# Altium schematic symbol library SCHLIB.SchLib: 2608 symbols (part 8 of 20) (continued)
## IC-STM32H743VIH6
designator U?, comment STM32H743VIH6
HIGH-PERFORMANCE AND DSP WITH DP; Manufacturer: STMicroelectronics; Supplier 1: Digi-Key; Supplier Part Number 1: 497-STM32H743VIH6-ND; Manufacturer Part Number: STM32H743VIH6; Stock: 618; Pricing: 1=13.52, 10=12.429, 25=11.914, 100=10.4971, 250=9.9819, 500=9.3379, 1000=8.5651, 2500=8.2431, 5000=8.1963 (USD); RoHS: No; ComponentLink1Description: Datasheet; ComponentLink1URL: https://www.st.com/resource/en/datasheet/stm32h743ai.pdf
footprint TFBGA100-A08Q-IPC_B
part A pins: B2 VBAT (power), C2 VSS (power), D2 VDD (power), E4 VSS (power), E5 VSS (power), E6 VSS (power), E7 VCAP (power), F4 VDDLDO (power), F5 VDD (power), F6 VDD33USB (power), F8 VCAP (power), G1 VSSA (power), H1 VDDA (power), J1 VSS (power), K1 VDD (power)
part B pins: A2 PC13 (io), A4 PB9-TIM17_CH1,TIM4_CH4,DFSDM1_DATIN7,I2C1_SDA,I2S2_WS/SPI2_NSS,I2C4_SDA,SDMMC1_CDIR,UART4_TX,FDCAN1_TX,SDMMC2_D5,I2C4_SMBA,SDMMC1_D5,DCMI_D7,LTDC_B7, (io), A5 PB7-TIM17_CH1N,TIM4_CH2,HRTIM_EEV9,I2C1_SDA,I2C4_SDA,USART1_RX,LPUART1_RX,DFSDM1_CKIN5,FMC_NL,DCMI_VSYNC, (io), A6 PB4 (NJTRST)-TIM16_BKIN,TIM3_CH1,HRTIM_EEV6,I2S1_SDI/SPI1_MISO,I2S3_SDI/SPI3_MISO,I2S2_WS/SPI2_NSS,SPI6_MISO,SDMMC2_D3,UART7_TX, (io), A7 PB3 (JTDO/TRACESWO)-DEBUG_JTDO-SWO,DEBUG_JTDO-SWO,TIM2_CH2,HRTIM_FLT4,I2S1_CK/SPI1_SCK,I2S3_CK/SPI3_SCK,SPI6_SCK,SDMMC2_D2,CRS_SYNC,UART7_RX, (io), A8 PA15-(JTDI)-DEBUG_JTDI,DEBUG_JTDI,TIM2_CH1/TIM2_ETR,HRTIM_FLT1,CEC,I2S1_WS/SPI1_NSS,I2S3_WS/SPI3_NSS,SPI6_NSS,UART4_DE/UART4_RTS,UART7_TX, (io), A9 PA14-(JTCK/SWCLK)-DEBUG_JTCK-SWCLK,DEBUG_JTCK-SWCLK, (io), A10 PA13-(JTMS/SWDIO)-DEBUG_JTMS-SWDIO,DEBUG_JTMS-SWDIO, (io), B4 PB8-TIM16_CH1,TIM4_CH3,DFSDM1_CKIN7,I2C1_SCL,I2C4_SCL,SDMMC1_CKIN,UART4_RX,FDCAN1_RX,SDMMC2_D4,ETH_TXD3,SDMMC1_D4,DCMI_D6,LTDC_B6, (io), B5 PB6-TIM16_CH1N,TIM4_CH1,HRTIM_EEV8,I2C1_SCL,CEC,I2C4_SCL,USART1_TX,LPUART1_TX,FDCAN2_TX,QUADSPI_BK1_NCS,DFSDM1_DATIN5,FMC_SDNE1,DCMI_D5,UART5_TX, (io), B8 PC11-HRTIM_FLT2,DFSDM1_DATIN5,I2S3_SDI/SPI3_MISO,USART3_RX,UART4_RX,QUADSPI_BK2_NCS,SDMMC1_D3,DCMI_D4, (io), B9 PC10-HRTIM_EEV1,DFSDM1_CKIN5,I2S3_CK/SPI3_SCK,USART3_TX,UART4_TX,QUADSPI_BK1_IO1,SDMMC1_D2,DCMI_D8,LTDC_R2, (io), B10 PA12-TIM1_ETR,HRTIM_CHD2,LPUART1_DE/LPUART1_RTS,I2S2_CK/SPI2_SCK,UART4_TX,USART1_DE/USART1_RTS,SAI2_FS_B,FDCAN1_TX,USB_OTG_FS_DP,LTDC_R5, (io), C5 PB5-TIM17_BKIN,TIM3_CH2,HRTIM_EEV7,I2C1_SMBA,I2S1_SDO/SPI1_MOSI,I2C4_SMBA,I2S3_SDO/SPI3_MOSI,SPI6_MOSI,FDCAN2_RX,USB_OTG_HS_ULPI_D7,ETH_PPS_OUT,FMC_SDCKE1,DCMI_D10,UART5_RX, (io), C8 PC12-DEBUG_TRACED3,DEBUG_TRACED3,HRTIM_EEV2,I2S3_SDO/SPI3_MOSI,USART3_CK,UART5_TX,SDMMC1_CK,DCMI_D9, (io), C9 PA9-TIM1_CH2,HRTIM_CHC1,LPUART1_TX,I2C3_SMBA,I2S2_CK/SPI2_SCK,USART1_TX,DCMI_D0,LTDC_R5, (io), C10 PA11-TIM1_CH4,HRTIM_CHD1,LPUART1_CTS,I2S2_WS/SPI2_NSS,UART4_RX,USART1_CTS/USART1_NSS,FDCAN1_RX,USB_OTG_FS_DM,LTDC_R4, (io), D9 PA8-RCC_MCO_1,RCC_MCO_1,TIM1_CH1,HRTIM_CHB2,TIM8_BKIN2,I2C3_SCL,USART1_CK,USB_OTG_FS_SOF,UART7_RX,TIM8_BKIN2_COMP1/TIM8_BKIN2_COMP2,LTDC_B3,LTDC_R6, (io), D10 PA10-TIM1_CH3,HRTIM_CHC2,LPUART1_RX,USART1_RX,USB_OTG_FS_ID,MDIOS_MDIO,LTDC_B4,DCMI_D1,LTDC_B1, (io), E2 PC2_C-DFSDM1_CKIN1,I2S2_SDI/SPI2_MISO,DFSDM1_CKOUT,USB_OTG_HS_ULPI_DIR,ETH_TXD2,FMC_SDNE0, (io), E9 PC9-RCC_MCO_2,RCC_MCO_2,TIM3_CH4,TIM8_CH4,I2C3_SDA,I2S_CKIN,UART5_CTS,QUADSPI_BK1_IO0,LTDC_G3,SWPMI1_SUSPEND,SDMMC1_D1,DCMI_D3,LTDC_B2, (io), E10 PC7-DEBUG_TRGIO,DEBUG_TRGIO,HRTIM_CHA2,TIM3_CH2,TIM8_CH2,DFSDM1_DATIN3,I2S3_MCK,USART6_RX,SDMMC1_D123DIR,FMC_NE1,SDMMC2_D7,SWPMI1_TX,SDMMC1_D7,DCMI_D1,LTDC_G6, (io), F1 PC0-DFSDM1_CKIN0,DFSDM1_DATIN4,SAI2_FS_B,USB_OTG_HS_ULPI_STP,FMC_SDNWE,LTDC_R5, (io), F2 PC1-DEBUG_TRACED0,DEBUG_TRACED0,SAI1_D1,DFSDM1_DATIN0,DFSDM1_CKIN4,I2S2_SDO/SPI2_MOSI,SAI1_SD_A,SAI4_SD_A,SDMMC2_CK,SAI4_D1,ETH_MDC,MDIOS_MDC, (io), F3 PC3_C-DFSDM1_DATIN1,I2S2_SDO/SPI2_MOSI,USB_OTG_HS_ULPI_NXT,ETH_TX_CLK,FMC_SDCKE0, (io), F9 PC8-DEBUG_TRACED1,DEBUG_TRACED1,HRTIM_CHB1,TIM3_CH3,TIM8_CH3,USART6_CK,UART5_DE/UART5_RTS,FMC_NCE/FMC_NE2,SWPMI1_RX,SDMMC1_D0,DCMI_D2, (io), F10 PC6-HRTIM_CHA1,TIM3_CH1,TIM8_CH1,DFSDM1_CKIN3,I2S2_MCK,USART6_TX,SDMMC1_D0DIR,FMC_NWAIT,SDMMC2_D6,SDMMC1_D6,DCMI_D0,LTDC_HSYNC, (io), G2 PA0-TIM2_CH1/TIM2_ETR,TIM5_CH1,TIM8_ETR,TIM15_BKIN,USART2_CTS/USART2_NSS,UART4_TX,SDMMC2_CMD,SAI2_SD_B,ETH_CRS, (io), G3 PA4-TIM5_ETR,I2S1_WS/SPI1_NSS,I2S3_WS/SPI3_NSS,USART2_CK,SPI6_NSS,USB_OTG_HS_SOF,DCMI_HSYNC,LTDC_VSYNC, (io), G4 PC4-DFSDM1_CKIN2,I2S1_MCK,SPDIFRX1_IN2,ETH_RXD0,FMC_SDNE0, (io), G5 PB2-RTC_OUT_ALARM/RTC_OUT_CALIB,RTC_OUT_ALARM/RTC_OUT_CALIB,SAI1_D1,DFSDM1_CKIN1,SAI1_SD_A,I2S3_SDO/SPI3_MOSI,SAI4_SD_A,QUADSPI_CLK,SAI4_D1, (io), G10 PB15-RTC_REFIN,RTC_REFIN,TIM1_CH3N,TIM12_CH2,TIM8_CH3N,USART1_RX,I2S2_SDO/SPI2_MOSI,DFSDM1_CKIN2,UART4_CTS,SDMMC2_D1,USB_OTG_HS_DP, (io), H2 PA1-TIM2_CH2,TIM5_CH2,LPTIM3_OUT,TIM15_CH1N,USART2_DE/USART2_RTS,UART4_RX,QUADSPI_BK1_IO3,SAI2_MCLK_B,ETH_REF_CLK/ETH_RX_CLK,LTDC_R2, (io), H3 PA5-TIM2_CH1/TIM2_ETR,TIM8_CH1N,I2S1_CK/SPI1_SCK,SPI6_SCK,USB_OTG_HS_ULPI_CK,LTDC_R4, (io), H4 PC5-SAI1_D3,DFSDM1_DATIN2,SPDIFRX1_IN3,SAI4_D3,ETH_RXD1,FMC_SDCKE0,COMP1_OUT, (io), H10 PB14-TIM1_CH2N,TIM12_CH1,TIM8_CH2N,USART1_TX,I2S2_SDI/SPI2_MISO,DFSDM1_DATIN2,USART3_DE/USART3_RTS,UART4_DE/UART4_RTS,SDMMC2_D0,USB_OTG_HS_DM, (io), J2 PA2-TIM2_CH3,TIM5_CH3,LPTIM4_OUT,TIM15_CH1,USART2_TX,SAI2_SCK_B,ETH_MDIO,MDIOS_MDIO,LTDC_R1, (io), J3 PA6-TIM1_BKIN,TIM3_CH1,TIM8_BKIN,I2S1_SDI/SPI1_MISO,SPI6_MISO,TIM13_CH1,TIM8_BKIN_COMP1/TIM8_BKIN_COMP2,MDIOS_MDC,TIM1_BKIN_COMP1/TIM1_BKIN_COMP2,DCMI_PIXCLK,LTDC_G2, (io), J4 PB0-TIM1_CH2N,TIM3_CH3,TIM8_CH2N,DFSDM1_CKOUT,UART4_CTS,LTDC_R3,USB_OTG_HS_ULPI_D1,ETH_RXD2,LTDC_G1, (io), J7 PB10-TIM2_CH3,HRTIM_SCOUT,LPTIM2_IN1,I2C2_SCL,I2S2_CK/SPI2_SCK,DFSDM1_DATIN7,USART3_TX,QUADSPI_BK1_NCS,USB_OTG_HS_ULPI_D3,ETH_RX_ER,LTDC_G4, (io), J8 PB13-TIM1_CH1N,LPTIM2_OUT,I2S2_CK/SPI2_SCK,DFSDM1_CKIN1,USART3_CTS/USART3_NSS,FDCAN2_TX,USB_OTG_HS_ULPI_D6,ETH_TXD1,UART5_TX, (io), K2 PA3-TIM2_CH4,TIM5_CH4,LPTIM5_OUT,TIM15_CH2,USART2_RX,LTDC_B2,USB_OTG_HS_ULPI_D0,ETH_COL,LTDC_B5, (io), K3 PA7-TIM1_CH1N,TIM3_CH2,TIM8_CH1N,I2S1_SDO/SPI1_MOSI,SPI6_MOSI,TIM14_CH1,ETH_CRS_DV/ETH_RX_DV,FMC_SDNWE, (io), K4 PB1-TIM1_CH3N,TIM3_CH4,TIM8_CH3N,DFSDM1_DATIN1,LTDC_R6,USB_OTG_HS_ULPI_D2,ETH_RXD3,LTDC_G0, (io), K7 PB11-TIM2_CH4,HRTIM_SCIN,LPTIM2_ETR,I2C2_SDA,DFSDM1_CKIN7,USART3_RX,USB_OTG_HS_ULPI_D4,ETH_TX_EN,LTDC_G5, (io), K8 PB12-TIM1_BKIN,I2C2_SMBA,I2S2_WS/SPI2_NSS,DFSDM1_DATIN1,USART3_CK,FDCAN2_RX,USB_OTG_HS_ULPI_D5,ETH_TXD0,USB_OTG_HS_ID,TIM1_BKIN_COMP1/TIM1_BKIN_COMP2,UART5_RX, (io)
part C pins: A1 PC14-OSC32 IN (io), A3 PE2-DEBUG_TRACECLK,DEBUG_TRACECLK,SAI1_CK1,SPI4_SCK,SAI1_MCLK_A,SAI4_MCLK_A,QUADSPI_BK1_IO2,SAI4_CK1,ETH_TXD3,FMC_A23, (io), B1 PC15-OSC32 OUT (io), B3 PE3-DEBUG_TRACED0,DEBUG_TRACED0,TIM15_BKIN,SAI1_SD_B,SAI4_SD_B,FMC_A19, (io), B6 PD5-HRTIM_EEV3,USART2_TX,FMC_NWE, (io), B7 PD2-DEBUG_TRACED2,DEBUG_TRACED2,TIM3_ETR,UART5_RX,SDMMC1_CMD,DCMI_D11, (io), C1 PH0-OSC IN (io), C3 PE4-DEBUG_TRACED1,DEBUG_TRACED1,SAI1_D2,DFSDM1_DATIN3,TIM15_CH1N,SPI4_NSS,SAI1_FS_A,SAI4_FS_A,SAI4_D2,FMC_A20,DCMI_D4,LTDC_B0, (io), C4 PE1-LPTIM1_IN2,HRTIM_SCOUT,UART8_TX,FMC_NBL1,DCMI_D3, (io), C6 PD6-SAI1_D1,DFSDM1_CKIN4,DFSDM1_DATIN1,I2S3_SDO/SPI3_MOSI,SAI1_SD_A,USART2_RX,SAI4_SD_A,SAI4_D1,SDMMC2_CK,FMC_NWAIT,DCMI_D10,LTDC_B2, (io), C7 PD3-DFSDM1_CKOUT,I2S2_CK/SPI2_SCK,USART2_CTS/USART2_NSS,FMC_CLK,DCMI_D5,LTDC_G7, (io), D1 PH1-OSC OUT (io), D3 PE5-DEBUG_TRACED2,DEBUG_TRACED2,SAI1_CK2,DFSDM1_CKIN3,TIM15_CH1,SPI4_MISO,SAI1_SCK_A,SAI4_SCK_A,SAI4_CK2,FMC_A21,DCMI_D6,LTDC_G0, (io), D4 PE0-LPTIM1_ETR,TIM4_ETR,HRTIM_SCIN,LPTIM2_ETR,UART8_RX,SAI2_MCLK_A,FMC_NBL0,DCMI_D2, (io), D5 BOOT0 (io), D6 PD7-DFSDM1_DATIN4,I2S1_SDO/SPI1_MOSI,DFSDM1_CKIN1,USART2_CK,SPDIFRX1_IN0,SDMMC2_CMD,FMC_NE1, (io), D7 PD4-HRTIM_FLT3,SAI3_FS_A,USART2_DE/USART2_RTS,FMC_NOE, (io), D8 PD0-DFSDM1_CKIN6,SAI3_SCK_A,UART4_RX,FDCAN1_RX,FMC_D2/FMC_DA2, (io), E1 ~{RST} (in), E3 PE6-DEBUG_TRACED3,DEBUG_TRACED3,TIM1_BKIN2,SAI1_D1,TIM15_CH2,SPI4_MOSI,SAI1_SD_A,SAI4_SD_A,SAI4_D1,SAI2_MCLK_B,TIM1_BKIN2_COMP1/TIM1_BKIN2_COMP2,FMC_A22,DCMI_D7,LTDC_G1, (io), E8 PD1-DFSDM1_DATIN6,SAI3_SD_A,UART4_TX,FDCAN1_TX,FMC_D3/FMC_DA3, (io), F7 PDR ON (io), G6 PE10-TIM1_CH2N,DFSDM1_DATIN4,UART7_CTS,QUADSPI_BK2_IO3,FMC_D7/FMC_DA7, (io), G7 PE14-TIM1_CH4,SPI4_MOSI,SAI2_MCLK_B,FMC_D11/FMC_DA11,LTDC_CLK, (io), G8 PD15-TIM4_CH4,SAI3_MCLK_A,UART8_DE/UART8_RTS,FMC_D1/FMC_DA1, (io), G9 PD11-LPTIM2_IN2,I2C4_SMBA,USART3_CTS/USART3_NSS,QUADSPI_BK1_IO0,SAI2_SD_A,FMC_A16, (io), H5 PE7-TIM1_ETR,DFSDM1_DATIN2,UART7_RX,QUADSPI_BK2_IO0,FMC_D4/FMC_DA4, (io), H6 PE11-TIM1_CH2,DFSDM1_CKIN4,SPI4_NSS,SAI2_SD_B,FMC_D8/FMC_DA8,LTDC_G3, (io), H7 PE15-TIM1_BKIN,FMC_D12/FMC_DA12,TIM1_BKIN_COMP1/TIM1_BKIN_COMP2,LTDC_R7, (io), H8 PD14-TIM4_CH3,SAI3_MCLK_B,UART8_CTS,FMC_D0/FMC_DA0, (io), H9 PD10-DFSDM1_CKOUT,SAI3_FS_B,USART3_CK,FMC_D15/FMC_DA15,LTDC_B3, (io), J5 PE8-TIM1_CH1N,DFSDM1_CKIN2,UART7_TX,QUADSPI_BK2_IO1,FMC_D5/FMC_DA5,COMP2_OUT, (io), J6 PE12-TIM1_CH3N,DFSDM1_DATIN5,SPI4_SCK,SAI2_SCK_B,FMC_D9/FMC_DA9,COMP1_OUT,LTDC_B4, (io), J9 PD9-DFSDM1_DATIN3,SAI3_SD_B,USART3_RX,FMC_D14/FMC_DA14, (io), J10 PD13-LPTIM1_OUT,TIM4_CH2,I2C4_SDA,QUADSPI_BK1_IO3,SAI2_SCK_A,FMC_A18, (io), K5 PE9-TIM1_CH1,DFSDM1_CKOUT,UART7_DE/UART7_RTS,QUADSPI_BK2_IO2,FMC_D6/FMC_DA6, (io), K6 PE13-TIM1_CH3,DFSDM1_CKIN5,SPI4_MISO,SAI2_FS_B,FMC_D10/FMC_DA10,COMP2_OUT,LTDC_DE, (io), K9 PD8-DFSDM1_CKIN3,SAI3_SCK_B,USART3_TX,SPDIFRX1_IN1,FMC_D13/FMC_DA13, (io), K10 PD12-LPTIM1_IN1,TIM4_CH1,LPTIM2_IN1,I2C4_SCL,USART3_DE/USART3_RTS,QUADSPI_BK1_IO1,SAI2_FS_A,FMC_A17, (io)

## IC-STM32L010K8T6
designator U?, comment STM32L010K8T6
16/32-BITS MICROS; Manufacturer: STMicroelectronics; Supplier 1: Digi-Key; Supplier Part Number 1: 497-19365-ND; Manufacturer Part Number: STM32L010K8T6; Stock: 300; Pricing: 1=1.87, 10=1.679, 25=1.584, 100=1.3496, 250=1.2672, 500=1.1088, 1000=0.9187, 2500=0.8554, 5000=0.8237 (USD); RoHS: No; ComponentLink1URL: http://www.farnell.com/datasheets/2710893.pdf?src-supplier=Farnell; ComponentLink1Description: http://www.farnell.com/datasheets/2710893.pdf?src-supplier=Farnell
footprint LQFP32
pins: 1 VDD (power), 2 PC14-OSC32 IN (io), 3 PC15-OSC32 OUT (io), 4 ~{RST} (in), 5 VDDA (power), 6 PA0 (io), 7 PA1 (io), 8 PA2 (io), 9 PA3 (io), 10 PA4 (io), 11 PA5 (io), 12 PA6 (io), 13 PA7 (io), 14 PB0 (io), 15 PB1 (io), 16 VSS (power), 17 VDD (power), 18 PA8 (io), 19 PA9 (io), 20 PA10 (io), 21 PA11 (io), 22 PA12 (io), 23 PA13 (io), 24 PA14 (io), 25 PA15 (io), 26 PB3 (io), 27 PB4 (io), 28 PB5 (io), 29 PB6 (io), 30 PB7 (io), 31 BOOT0 (in), 32 VSS (power)

## IC-STM32L431KBU6
designator U?, comment STM32L431KBU6
IC MCU 32BIT 128KB FLASH; Manufacturer: STMicroelectronics; Interface: I2C,SPI,IrDA,UART,USART; Peripherals: Brown-out Detect/Reset,PWM,WDT,DMA; Core Architecture: ARM; Frequency: 80MHz; Number of I/Os: 26; Oscillator Type: Internal; Supplier 1: Digi-Key; Supplier Part Number 1: 497-18595-ND; Manufacturer Part Number: STM32L431KBU6; Stock: 1452; Pricing: 1=4.18, 10=3.75, 25=3.5456, 100=3.0728, 250=2.9152, 500=2.6158, 1000=2.2061, 2500=2.0958, 5000=2.017 (USD); RoHS: No; Case/Package: UFQFPN; Min Operating Temperature: -40°C; Max Operating Temperature: 85°C; Memory Type: FLASH; Packaging: Tray; Memory Size: 128KB; ComponentLink1URL: http://www.st.com/content/ccc/resource/technical/document/reference_manual/group0/b0/ac/3e/8f/6d/21/47/af/DM00151940/files/DM00151940.pdf/jcr:content/translations/en.DM00151940.pdf?src-supplier=Digi-Key; ComponentLink1Description: http://www.st.com/content/ccc/resource/technical/document/reference_manual/group0/b0/ac/3e/8f/6d/21/47/af/DM00151940/files/DM00151940.pdf/jcr:content/translations/en.DM00151940.pdf?src-supplier=Digi-Key
footprint STM-UFQFPN32_L (QFN, 32-Leads, Body 5.1x5.1mm, Pitch 0.5mm, Thermal Pad 3.5x3.5mm, IPC High Density)
pins: 1 VDD (power), 2 PC14-OSC32 IN (io), 3 PC15-OSC32 OUT (io), 4 ~{RST} (in), 5 VDDA (power), 6 PA0 (io), 7 PA1 (io), 8 PA2 (io), 9 PA3 (io), 10 PA4 (io), 11 PA5 (io), 12 PA6 (io), 13 PA7 (io), 14 PB0 (io), 15 PB1 (io), 16 VSS (power), 17 VDD (power), 18 PA8 (io), 19 PA9 (io), 20 PA10 (io), 21 PA11 (io), 22 PA12 (io), 23 PA13 (io), 24 PA14 (io), 25 PA15 (io), 26 PB3 (io), 27 PB4 (io), 28 PB5 (io), 29 PB6 (io), 30 PB7 (io), 31 BOOT0 (in), 32 VSS (power), 33 VSS (power)

## IC-TBD62783AFG,EL
designator U?, comment TBD62783AFG,EL  Case/Package: SOIC18
IC LOAD SWITCH 8CH 0.5A 18SOP; Manufacturer: Toshiba; Number of Outputs: 8; Interface: On/Off; Max Output Current: 500mA; Output Configuration: High Side; Washability: OK; Supplier 1: Digi-Key; Manufacturer Part Number: TBD62783AFG,EL; Stock 1: 9707; Pricing 1: 1=1,09000, 10=0,97200, 25=0,92280, 100=0,70860, 250=0,62624, 500=0,59328 (USD); RoHS: Yes; Number of Pins: 18; Min Operating Temperature: -40°C; Max Operating Temperature: 85°C; Packaging: Cut Tape; ComponentLink1URL: https://toshiba.semicon-storage.com/info/docget.jsp?did=30523&prodName=TBD62783AFG&src-supplier=Digi-Key; ComponentLink1Description: https://toshiba.semicon-storage.com/info/docget.jsp?did=30523&prodName=TBD62783AFG&src-supplier=Digi-Key; ComponentLink2URL: http://www.toshiba.semicon-storage.com/info/docget.jsp?did=14247&src-supplier=Digi-Key; ComponentLink2Description: http://www.toshiba.semicon-storage.com/info/docget.jsp?did=14247&src-supplier=Digi-Key; Supplier Part Number 1: TBD62783AFGELCT-ND
footprint SOIC18
pins: 1 IN1 (in), 2 IN2 (in), 3 IN3 (in), 4 IN4 (in), 5 IN5 (in), 6 IN6 (in), 7 IN7 (in), 8 IN8 (in), 9 GND, 10 VCC, 11 OUT8 (out), 12 OUT7 (out), 13 OUT6 (out), 14 OUT5 (out), 15 OUT4 (out), 16 OUT3 (out), 17 OUT2 (out), 18 OUT1 (out)

## IC-TCA6408AQPWRQ1
designator U?, comment TCA6408AQ
IC I/O EXPANDER I2C 8B 16TSSOP; Manufacturer: Texas Instruments; Manufacturer Part Number: TCA6408AQPWRQ1; Number of I/Os: 8; Supplier 1: Digi-Key; Supplier Part Number 1: 296-44902-1-ND; Stock: 1976; Pricing: 1=1.6, 10=1.428, 25=1.3552, 100=1.0406, 250=0.9196, 500=0.8712, 1000=0.6776 (USD); RoHS: No; Case/Package: TSSOP; Min Operating Temperature: -40°C; Max Operating Temperature: 125°C; Lead Free: Lead Free; ComponentLink1URL: http://www.ti.com/lit/ds/symlink/tca6408a-q1.pdf?src-supplier=Digi-Key; ComponentLink1Description: http://www.ti.com/lit/ds/symlink/tca6408a-q1.pdf?src-supplier=Digi-Key; ComponentLink2URL: http://www.ti.com/general/docs/suppproductinfo.tsp?distId=10&amp;gotoUrl=http%3A%2F%2Fwww.ti.com%2Flit%2Fgpn%2Ftca6408a-q1&src-supplier=Digi-Key; ComponentLink2Description: http://www.ti.com/general/docs/suppproductinfo.tsp?distId=10&amp;gotoUrl=http%3A%2F%2Fwww.ti.com%2Flit%2Fgpn%2Ftca6408a-q1&src-supplier=Digi-Key
footprint TSSOP16
pins: 1 VCCI (power) "Supply voltage of I2C bus. Connect directly to the VCCI of the external I2C master. Provides voltage leveltranslation", 2 ADDR (in) "Address input. Connect directly to VCCI or ground", 3 ~{RESET} (in) "Active-low reset input. Connect to VCC  through a pullup resistor, if no active connection is used.", 4 P0 (io) "P-port input/output. (Push-pull design structure.) At power on, P0 is configured as an input.", 5 P1 (io) "P-port input/output. (Push-pull design structure.) At power on, P1 is configured as an input.", 6 P2 (io) "P-port input/output. (Push-pull design structure.) At power on, P2 is configured as an input.", 7 P3 (io) "P-port input/output. (Push-pull design structure.) At power on, P3 is configured as an input.", 8 GND (power) "Ground", 9 P4 (io) "P-port input/output. (Push-pull design structure.) At power on, P4 is configured as an input.", 10 P5 (io) "P-port input/output. (Push-pull design structure.) At power on, P5 is configured as an input.", 11 P6 (io) "P-port input/output. (Push-pull design structure.) At power on, P6 is configured as an input.", 12 P7 (io) "P-port input/output. (Push-pull design structure.) At power on, P7 is configured as an input.", 13 ~{INT} (oc) "Interrupt output. Connect to VCCI through a pullup resistor.", 14 SCL (in) "Serial clock bus. Connect to VCCI through a pullup resistor.", 15 SDA (io) "Serial data bus. Connect to VCCI through a pullup resistor.", 16 VCCP (power) "Supply voltage of TCA6408A for P port"

## IC-TCA9534APWR
designator U?, comment TCA9534APWR  Case/Package: TSSOP16
IC I/O EXPANDER I2C 8B 16TSSOP; Manufacturer: Texas Instruments; Number of I/Os: 8; Frequency: 400kHz; Washability: OK; Supplier 1: Digi-Key; Manufacturer Part Number: TCA9534APWR; Stock 1: 2998; Pricing 1: 1=1,29000, 10=1,15200, 25=1,09320, 100=0,83930, 250=0,74172, 500=0,70266, 1000=0,54652 (USD); RoHS: Yes; Mount: Surface Mount; Number of Pins: 16; Contact Plating: Gold; Min Operating Temperature: -40°C; Max Operating Temperature: 85°C; Packaging: Tape and Reel; Interface: I2C; Number of Outputs: 8; Lead Free: Lead Free; ComponentLink1URL: http://www.ti.com/general/docs/lit/getliterature.tsp?genericPartNumber=TCA9534A&&fileType=pdf&src-supplier=Avnet; ComponentLink1Description: http://www.ti.com/general/docs/lit/getliterature.tsp?genericPartNumber=TCA9534A&&fileType=pdf&src-supplier=Avnet; ComponentLink2URL: http://www.ti.com/lit/ds/symlink/tca9534a.pdf?src-supplier=Digi-Key; ComponentLink2Description: http://www.ti.com/lit/ds/symlink/tca9534a.pdf?src-supplier=Digi-Key; ComponentLink3URL: http://www.ti.com/general/docs/lit/getliterature.tsp?genericPartNumber=TCA9534A&&fileType=pdf&src-supplier=Avnet+Asia; ComponentLink3Description: http://www.ti.com/general/docs/lit/getliterature.tsp?genericPartNumber=TCA9534A&&fileType=pdf&src-supplier=Avnet+Asia; ComponentLink4URL: http://www.ti.com/lit/pdf/sszc003?src-supplier=Digi-Key; ComponentLink4Description: http://www.ti.com/lit/pdf/sszc003?src-supplier=Digi-Key; Supplier Part Number 1: 296-40573-1-ND
footprint TSSOP16
pins: 1 A0 (in), 2 A1 (in), 3 A2 (in), 4 P0 (io), 5 P1 (io), 6 P2 (io), 7 P3 (io), 8 GND (power), 9 P4 (io), 10 P5 (io), 11 P6 (io), 12 P7 (io), 13 ~{INT} (out), 14 SCL (in), 15 SDA (io), 16 VCC (power)

## IC-TCA9535PWR
designator U?, comment TCA9535PWR
IC I/O EXPANDER I2C 16B 24TSSOP; Manufacturer: Texas Instruments; Min Supply Voltage: 1.65V; Max Supply Voltage: 5.5V; Number of I/Os: 16; Max Frequency: 400kHz; Washability: OK; Supplier 1: Digi-Key; Manufacturer Part Number: TCA9535PWR; Stock 1: 31176; Pricing 1: 1=1.5, 10=1.337, 100=1.0424, 500=0.86108, 1000=0.6798 (USD); Case/Package: TSSOP; Number of Pins: 24; Weight: 0.007478oz; Min Operating Temperature: -40°C; Max Operating Temperature: 85°C; Packaging: Tape and Reel; Package Quantity: 2000; Frequency: 400kHz; REACH SVHC: No SVHC; Lead Free: Lead Free; ComponentLink1URL: http://www.farnell.com/datasheets/1857174.pdf?src-supplier=Element14; ComponentLink1Description: http://www.farnell.com/datasheets/1857174.pdf?src-supplier=Element14; ComponentLink2URL: http://focus.ti.com/lit/ds/symlink/tca9535.pdf?src-supplier=Avnet+Europe; ComponentLink2Description: http://focus.ti.com/lit/ds/symlink/tca9535.pdf?src-supplier=Avnet+Europe; ComponentLink3URL: http://www.ti.com/lit/gpn/tca9535?src-supplier=Mouser; ComponentLink3Description: http://www.ti.com/lit/gpn/tca9535?src-supplier=Mouser; ComponentLink4URL: http://www.ti.com/lit/pdf/ssiy004?src-supplier=Digi-Key; ComponentLink4Description: http://www.ti.com/lit/pdf/ssiy004?src-supplier=Digi-Key; ComponentLink5URL: http://www.ti.com/general/docs/lit/getliterature.tsp?genericPartNumber=TCA9535&&fileType=pdf&src-supplier=Avnet; ComponentLink5Description: http://www.ti.com/general/docs/lit/getliterature.tsp?genericPartNumber=TCA9535&&fileType=pdf&src-supplier=Avnet; ComponentLink6URL: http://www.produktinfo.conrad.com/datenblaetter/1100000-1199999/001187866-da-01-en-IC_I_O_EXPANDER_TCA9535PWR_TSSOP_24_TID.pdf?src-supplier=Conrad; ComponentLink6Description: http://www.produktinfo.conrad.com/datenblaetter/1100000-1199999/001187866-da-01-en-IC_I_O_EXPANDER_TCA9535PWR_TSSOP_24_TID.pdf?src-supplier=Conrad; Supplier Part Number 1: 296-25129-1-ND
footprint TSSOP24 - NOEP
pins: 1 ~{INT} (out), 2 A1 (in), 3 A2 (in), 4 P00 (io), 5 P01 (io), 6 P02 (io), 7 P03 (io), 8 P04 (io), 9 P05 (io), 10 P06 (io), 11 P07 (io), 12 GND (power), 13 P10 (io), 14 P11 (io), 15 P12 (io), 16 P13 (io), 17 P14 (io), 18 P15 (io), 19 P16 (io), 20 P17 (io), 21 A0 (in), 22 SCL (in), 23 SDA (io), 24 VCC (power)

## IC-TCA9617BDGKR
designator U?, comment TCA9617BDGKR
IC TRNSLTR BIDIRECTIONAL 8VSSOP; Manufacturer 1: Texas Instruments; Number of Circuits: 1; Number of Outputs: 2; Washability: OK; Supplier 1: Digi-Key; Manufacturer Part Number 1: TCA9617BDGKR; Stock 1: 5832; Pricing 1: 1=1,04000, 10=0,93300, 25=0,88520, 100=0,72730, 250=0,67984, 500=0,60080, 1000=0,47432 (USD); RoHS: Yes; Mount: Surface Mount; Case/Package: VSSOP; Min Operating Temperature: -40°C; Max Operating Temperature: 85°C; Packaging: Tape and Reel; Channel Type: Bidirectional; Package Quantity: 2500; Lead Free: Lead Free; ComponentLink1URL: http://www.ti.com/lit/ds/symlink/tca9617b.pdf?src-supplier=Digi-Key; ComponentLink1Description: http://www.ti.com/lit/ds/symlink/tca9617b.pdf?src-supplier=Digi-Key; ComponentLink2URL: http://www.ti.com/general/docs/lit/getliterature.tsp?genericPartNumber=TCA9617B&&fileType=pdf&src-supplier=Avnet; ComponentLink2Description: http://www.ti.com/general/docs/lit/getliterature.tsp?genericPartNumber=TCA9617B&&fileType=pdf&src-supplier=Avnet; ComponentLink3URL: http://www.ti.com/lit/gpn/tca9617b?src-supplier=Mouser; ComponentLink3Description: http://www.ti.com/lit/gpn/tca9617b?src-supplier=Mouser; Supplier Part Number 1: 296-40579-1-ND
footprint MSOP8 (TSOP, 8-Leads, Body 3,00x3,00mm, Pitch 0,65mm, IPC Medium Density)
pins: 1 VCC_A (power), 2 SCLK_A (in), 3 SDATA_A (io), 4 GND (power), 5 EN (in), 6 SDATA_B (io), 7 SCLK_B (out), 8 VCC_B (power)

## IC-TCAN330DR
designator U?, comment TCAN330DR
IC TXRX CAN 3.3V 8SOIC; Manufacturer: Texas Instruments; Data Rate: 1Mbps; Supplier 1: Digi-Key; Supplier Part Number 1: 296-48676-1-ND; Manufacturer Part Number: TCAN330DR; Stock: 6026; Pricing: 1=2.3, 10=2.064, 25=1.9476, 100=1.558, 250=1.3632, 500=1.3243, 1000=1.0517 (USD); RoHS: No; Mount: Surface Mount; Case/Package: SOIC; Number of Pins: 8; Min Operating Temperature: -40°C; Max Operating Temperature: 125°C; Packaging: Cut Tape; Lead Free: Lead Free; ComponentLink1URL: http://www.ti.com/lit/ds/symlink/tcan330.pdf?src-supplier=Digi-Key; ComponentLink1Description: http://www.ti.com/lit/ds/symlink/tcan330.pdf?src-supplier=Digi-Key; ComponentLink2URL: http://www.ti.com/general/docs/suppproductinfo.tsp?distId=10&amp;gotoUrl=http%3A%2F%2Fwww.ti.com%2Flit%2Fgpn%2Ftcan330&src-supplier=Digi-Key; ComponentLink2Description: http://www.ti.com/general/docs/suppproductinfo.tsp?distId=10&amp;gotoUrl=http%3A%2F%2Fwww.ti.com%2Flit%2Fgpn%2Ftcan330&src-supplier=Digi-Key; ComponentLink3URL: http://www.ti.com/lit/gpn/tcan330?src-supplier=Mouser; ComponentLink3Description: http://www.ti.com/lit/gpn/tcan330?src-supplier=Mouser
footprint SOIC8-D0008A_M (SOIC, 8-Leads, Body 5x4mm, Pitch 1.27mm, IPC Low Density)
pins: 1 TX (in), 2 GND (power), 3 VCC (power), 4 RX (out), 5 EN (in), 6 CANL (io), 7 CANH (io), 8 S (in)

## IC-THS7374IPWR
designator U?, comment THS7374
IC AMP BUFFER 14TSSOP; Manufacturer: Texas Instruments; Manufacturer Part Number: THS7374IPWR; Supply Type: Single; Max Supply Voltage: 5V; Number of Circuits: 4; Min Supply Voltage: 3V; Operating Supply Current: 10mA; Output Current per Channel: 90mA; -3db Bandwidth: 9.5MHz; Slew Rate: 130V/µs; Gain: 6dB; Washability: OK; Supplier 1: Mouser; Stock 1: 3762; Pricing 1: 1=0,83000, 10=0,68300, 100=0,51700, 250=0,44000, 500=0,41800, 1000=0,31900 (USD); RoHS: Yes; Mount: Surface Mount; Case/Package: TSSOP; Number of Pins: 14; Weight: 0.002018oz; Contact Plating: Gold; Min Operating Temperature: -40°C; Max Operating Temperature: 85°C; Packaging: Tape and Reel; Number of Channels: 4; Package Quantity: 2000; Nominal Supply Current: 10mA; Radiation Hardening: No; Lead Free: Lead Free; ComponentLink1URL: https://datasheet.ciiva.com/15128/getdatasheetpartid-531071-15128097.pdf?src-supplier=Verical; ComponentLink1Description: https://datasheet.ciiva.com/15128/getdatasheetpartid-531071-15128097.pdf?src-supplier=Verical; ComponentLink2URL: https://datasheet.ciiva.com/16465/slos590b-16465185.pdf?src-supplier=Avnet+Asia; ComponentLink2Description: https://datasheet.ciiva.com/16465/slos590b-16465185.pdf?src-supplier=Avnet+Asia; ComponentLink3URL: https://datasheet.ciiva.com/1824/ths7374-1824882.pdf?src-supplier=Digi-Key; ComponentLink3Description: https://datasheet.ciiva.com/1824/ths7374-1824882.pdf?src-supplier=Digi-Key; ComponentLink4URL: https://datasheet.ciiva.com/2978/ths7374-2978179.pdf?src-supplier=Avnet; ComponentLink4Description: https://datasheet.ciiva.com/2978/ths7374-2978179.pdf?src-supplier=Avnet; ComponentLink5URL: https://datasheet.ciiva.com/2978/ths7374-2978178.pdf?src-supplier=Avnet; ComponentLink5Description: https://datasheet.ciiva.com/2978/ths7374-2978178.pdf?src-supplier=Avnet; ComponentLink6URL: https://datasheet.ciiva.com/26116/slos590b-26116652.pdf?src-supplier=Avnet+Europe; ComponentLink6Description: https://datasheet.ciiva.com/26116/slos590b-26116652.pdf?src-supplier=Avnet+Europe; Supplier Part Number 1: 595-THS7374IPWR
footprint THS7374 (TSOP, 14-Leads, Body 5,00x4,40mm, Pitch 0,65mm, IPC Medium Density)
pins: 1 IN1, 2 IN2, 3 IN3, 4 IN4, 5 GND, 6 DISABLE, 7 NC, 8 NC, 9 BYPASS, 10 VS+, 11 OUT4, 12 OUT3, 13 OUT2, 14 OUT1

## IC-THVD1450DRBT
designator IC?, comment THVD1450DRBT
3.3-V to 5-V RS-485 transceiver with ±18-kV IEC ESD protection 8-SON -40 to 125; Manufacturer: Texas Instruments; Supplier 1: Arrow; Manufacturer Part Number: THVD1450DRBT; Stock 1: 500; Pricing 1: 250=1,66000, 500=1,60000, 1250=1,38810, 250=1,66300, 2500=1,62000, 25000=1,35500, 125000=1,19600, 250000=1,19400 (USD); RoHS: No; Supplier Part Number 1: THVD1450DRBT
footprint VSON8 - DRB0008F (DRB0008F  THVD1450)
pins: 1 R (out), 2 ~{RE}, 3 DE, 4 D (in), 5 GND, 6 A (io), 7 B (io), 8 Vcc, 9 EP

## IC-TIOL111DMWR
designator U?, comment TIOL111
IC TRANSCEIVER 1/1 10VSON; Manufacturer: Texas Instruments; Manufacturer Part Number: TIOL111DMWR; Receiver Hysteresis: 750mV; Data Rate: 250Kbps; Supplier 1: Digi-Key; Supplier Part Number 1: 296-49943-1-ND; Stock: 596; Pricing: 1=3.47, 10=3.12, 25=2.9496, 100=2.4254, 250=2.1763, 500=2.0976 (USD); RoHS: No; Mount: Surface Mount; Min Operating Temperature: -40°C; Max Operating Temperature: 125°C; Packaging: Cut Tape; ComponentLink1URL: http://www.ti.com/lit/ds/symlink/tiol111.pdf?src-supplier=Digi-Key; ComponentLink1Description: http://www.ti.com/lit/ds/symlink/tiol111.pdf?src-supplier=Digi-Key
footprint 10-VSON EP (SON, 10-Leads, Body 3x3mm, Pitch 0.5mm, Thermal Pad 2.4x1.65mm, TI Recommended)
pins: 1 VCC_IN/OUT , 2 NFAULT, 3 RX, 4 TX, 5 EN, 6 ILIM, 7 L-, 8 CQ, 9 L+, 10 WAKE, 11 GND

## IC-TJA1051T,118
designator U?, comment TJA1051T,118
IC CAN TXRX HI-SPEED 8-SOIC; Manufacturer: NXP Semiconductors; Data Rate: 1Mbps; Min Supply Voltage: 4.5V; Max Supply Voltage: 5.5V; Number of Transceivers: 1; Nominal Supply Current: 70mA; Operating Supply Voltage: 5V; Washability: OK; Supplier 1: Digi-Key; Manufacturer Part Number: TJA1051T,118; Stock 1: 59856; Pricing 1: 1=1.12000, 10=1.00000, 100=0.77990, 500=0.64426, 1000=0.50862 (USD); RoHS: Yes; Mount: Surface Mount; Case/Package: SO; Number of Pins: 8; Min Operating Temperature: -40°C; Max Operating Temperature: 125°C; Package Quantity: 1; Packaging: Tape and Reel; Max Supply Current: 70mA; Interface: CAN; Radiation Hardening: No; Lead Free: Lead Free; ComponentLink1URL: https://datasheet.ciiva.com/1767/tja1051-1767286.pdf?src-supplier=Digi-Key; ComponentLink1Description: https://datasheet.ciiva.com/1767/tja1051-1767286.pdf?src-supplier=Digi-Key; ComponentLink2URL: https://datasheet.ciiva.com/16199/tja1051-16199462.pdf?src-supplier=Future+Electronics; ComponentLink2Description: https://datasheet.ciiva.com/16199/tja1051-16199462.pdf?src-supplier=Future+Electronics; ComponentLink3URL: https://datasheet.ciiva.com/1767/tja1051-1767287.pdf?src-supplier=Digi-Key; ComponentLink3Description: https://datasheet.ciiva.com/1767/tja1051-1767287.pdf?src-supplier=Digi-Key; ComponentLink4URL: https://datasheet.ciiva.com/11212/tja1051-11212759.pdf?src-supplier=Avnet; ComponentLink4Description: https://datasheet.ciiva.com/11212/tja1051-11212759.pdf?src-supplier=Avnet; ComponentLink5URL: https://datasheet.ciiva.com/1767/tja1051-1767288.pdf?src-supplier=Digi-Key; ComponentLink5Description: https://datasheet.ciiva.com/1767/tja1051-1767288.pdf?src-supplier=Digi-Key; ComponentLink6URL: https://datasheet.ciiva.com/15149/getdatasheetpartid-248780-15149981.pdf?src-supplier=Verical; ComponentLink6Description: https://datasheet.ciiva.com/15149/getdatasheetpartid-248780-15149981.pdf?src-supplier=Verical; Supplier Part Number 1: 568-8683-1-ND
footprint SOIC8
pins: 1 TX (in), 2 GND (power), 3 VCC (power), 4 RX (out), 5 NC (in), 6 CANL (io), 7 CANH (io), 8 S (in)

## IC-TJA1051T/3/1J
designator U?, comment TJA1051T/3
IC CAN TRANSEIVER HS 8SOIC; Manufacturer: NXP Semiconductors; Manufacturer Part Number: TJA1051T/3/1J; Data Rate: 5Mbps; Min Supply Voltage: 4.5V; Max Supply Voltage: 5.5V; Number of Transceivers: 1; Simplex/Duplex: Half Duplex; Receiver Hysteresis: 120mV; Max Supply Current: 70mA; Washability: OK; Supplier 1: Digi-Key; Stock 1: 2965; Pricing 1: 1=1.07000, 10=0.95300, 100=0.74270, 500=0.61352, 1000=0.48437 (USD); RoHS: Yes; Mount: Surface Mount; Case/Package: SOIC; Number of Pins: 8; Contact Plating: Gold,Silver; Min Operating Temperature: -40°C; Max Operating Temperature: 150°C; Packaging: Tape and Reel; REACH SVHC: No SVHC; Lead Free: Lead Free; ComponentLink1URL: http://www.farnell.com/datasheets/1931504.pdf?src-supplier=Farnell; ComponentLink1Description: http://www.farnell.com/datasheets/1931504.pdf?src-supplier=Farnell; ComponentLink2URL: http://www.nxp.com/documents/data_sheet/TJA1051.pdf?src-supplier=Avnet; ComponentLink2Description: http://www.nxp.com/documents/data_sheet/TJA1051.pdf?src-supplier=Avnet; ComponentLink3URL: http://www.nxp.com/documents/data_sheet/TJA1051.pdf?src-supplier=Avnet+Asia; ComponentLink3Description: http://www.nxp.com/documents/data_sheet/TJA1051.pdf?src-supplier=Avnet+Asia; ComponentLink4URL: https://www.nxp.com/docs/en/data-sheet/TJA1051.pdf?src-supplier=Digi-Key; ComponentLink4Description: https://www.nxp.com/docs/en/data-sheet/TJA1051.pdf?src-supplier=Digi-Key; ComponentLink5URL: http://www.farnell.com/datasheets/1931504.pdf?src-supplier=Element14; ComponentLink5Description: http://www.farnell.com/datasheets/1931504.pdf?src-supplier=Element14; Supplier Part Number 1: 568-13277-1-ND
footprint SOIC8
pins: 1 TX (in), 2 GND (power), 3 VCC (power), 4 RX (out), 5 VIO (in), 6 CANL (io), 7 CANH (io), 8 S (in)

## IC-TJA1051T/E,118
designator U?, comment TJA1051T/E,118
IC TRANSCEIVER HALF 1/1 8SO; Manufacturer: NXP Semiconductors; Data Rate: 1Mbps; Max Supply Voltage: 5.5V; Operating Supply Voltage: 5V; Min Supply Voltage: 4.5V; Nominal Supply Current: 70mA; Number of Transceivers: 1; Washability: OK; ComponentLink1URL: https://datasheet.ciiva.com/16639/tja1051-16639386.pdf?src-supplier=Avnet+Europe; ComponentLink1Description: https://datasheet.ciiva.com/16639/tja1051-16639386.pdf?src-supplier=Avnet+Europe; ComponentLink2URL: https://datasheet.ciiva.com/11212/tja1051-11212764.pdf?src-supplier=Avnet; ComponentLink2Description: https://datasheet.ciiva.com/11212/tja1051-11212764.pdf?src-supplier=Avnet; ComponentLink3URL: https://datasheet.ciiva.com/1767/tja1051-1767286.pdf?src-supplier=Digi-Key; ComponentLink3Description: https://datasheet.ciiva.com/1767/tja1051-1767286.pdf?src-supplier=Digi-Key; ComponentLink4URL: https://datasheet.ciiva.com/16199/tja1051-16199462.pdf?src-supplier=Future+Electronics; ComponentLink4Description: https://datasheet.ciiva.com/16199/tja1051-16199462.pdf?src-supplier=Future+Electronics; ComponentLink5URL: https://datasheet.ciiva.com/1767/tja1051-1767287.pdf?src-supplier=Digi-Key; ComponentLink5Description: https://datasheet.ciiva.com/1767/tja1051-1767287.pdf?src-supplier=Digi-Key; ComponentLink6URL: https://datasheet.ciiva.com/11212/tja1051-11212759.pdf?src-supplier=Avnet; ComponentLink6Description: https://datasheet.ciiva.com/11212/tja1051-11212759.pdf?src-supplier=Avnet; ComponentLink7URL: https://datasheet.ciiva.com/1767/tja1051-1767288.pdf?src-supplier=Digi-Key; ComponentLink7Description: https://datasheet.ciiva.com/1767/tja1051-1767288.pdf?src-supplier=Digi-Key; ComponentLink8URL: https://datasheet.ciiva.com/15149/getdatasheetpartid-248780-15149981.pdf?src-supplier=Verical; ComponentLink8Description: https://datasheet.ciiva.com/15149/getdatasheetpartid-248780-15149981.pdf?src-supplier=Verical; Supplier 1: Digi-Key; Manufacturer Part Number: TJA1051T/E,118; Stock 1: 48191; Pricing 1: 1=1.07000, 10=0.95300, 100=0.74270, 500=0.61352, 1000=0.48437 (USD); RoHS: Yes; Mount: Surface Mount; Case/Package: SO; Number of Pins: 8; Min Operating Temperature: -40°C; Max Operating Temperature: 150°C; Packaging: Tape and Reel; Package Quantity: 2500; Radiation Hardening: No; Lead Free: Lead Free; Supplier Part Number 1: 568-8685-1-ND
footprint SOIC8
pins: 1 TX (in), 2 GND (power), 3 VCC (power), 4 RX (out), 5 EN (in), 6 CANL (io), 7 CANH (io), 8 S (in)

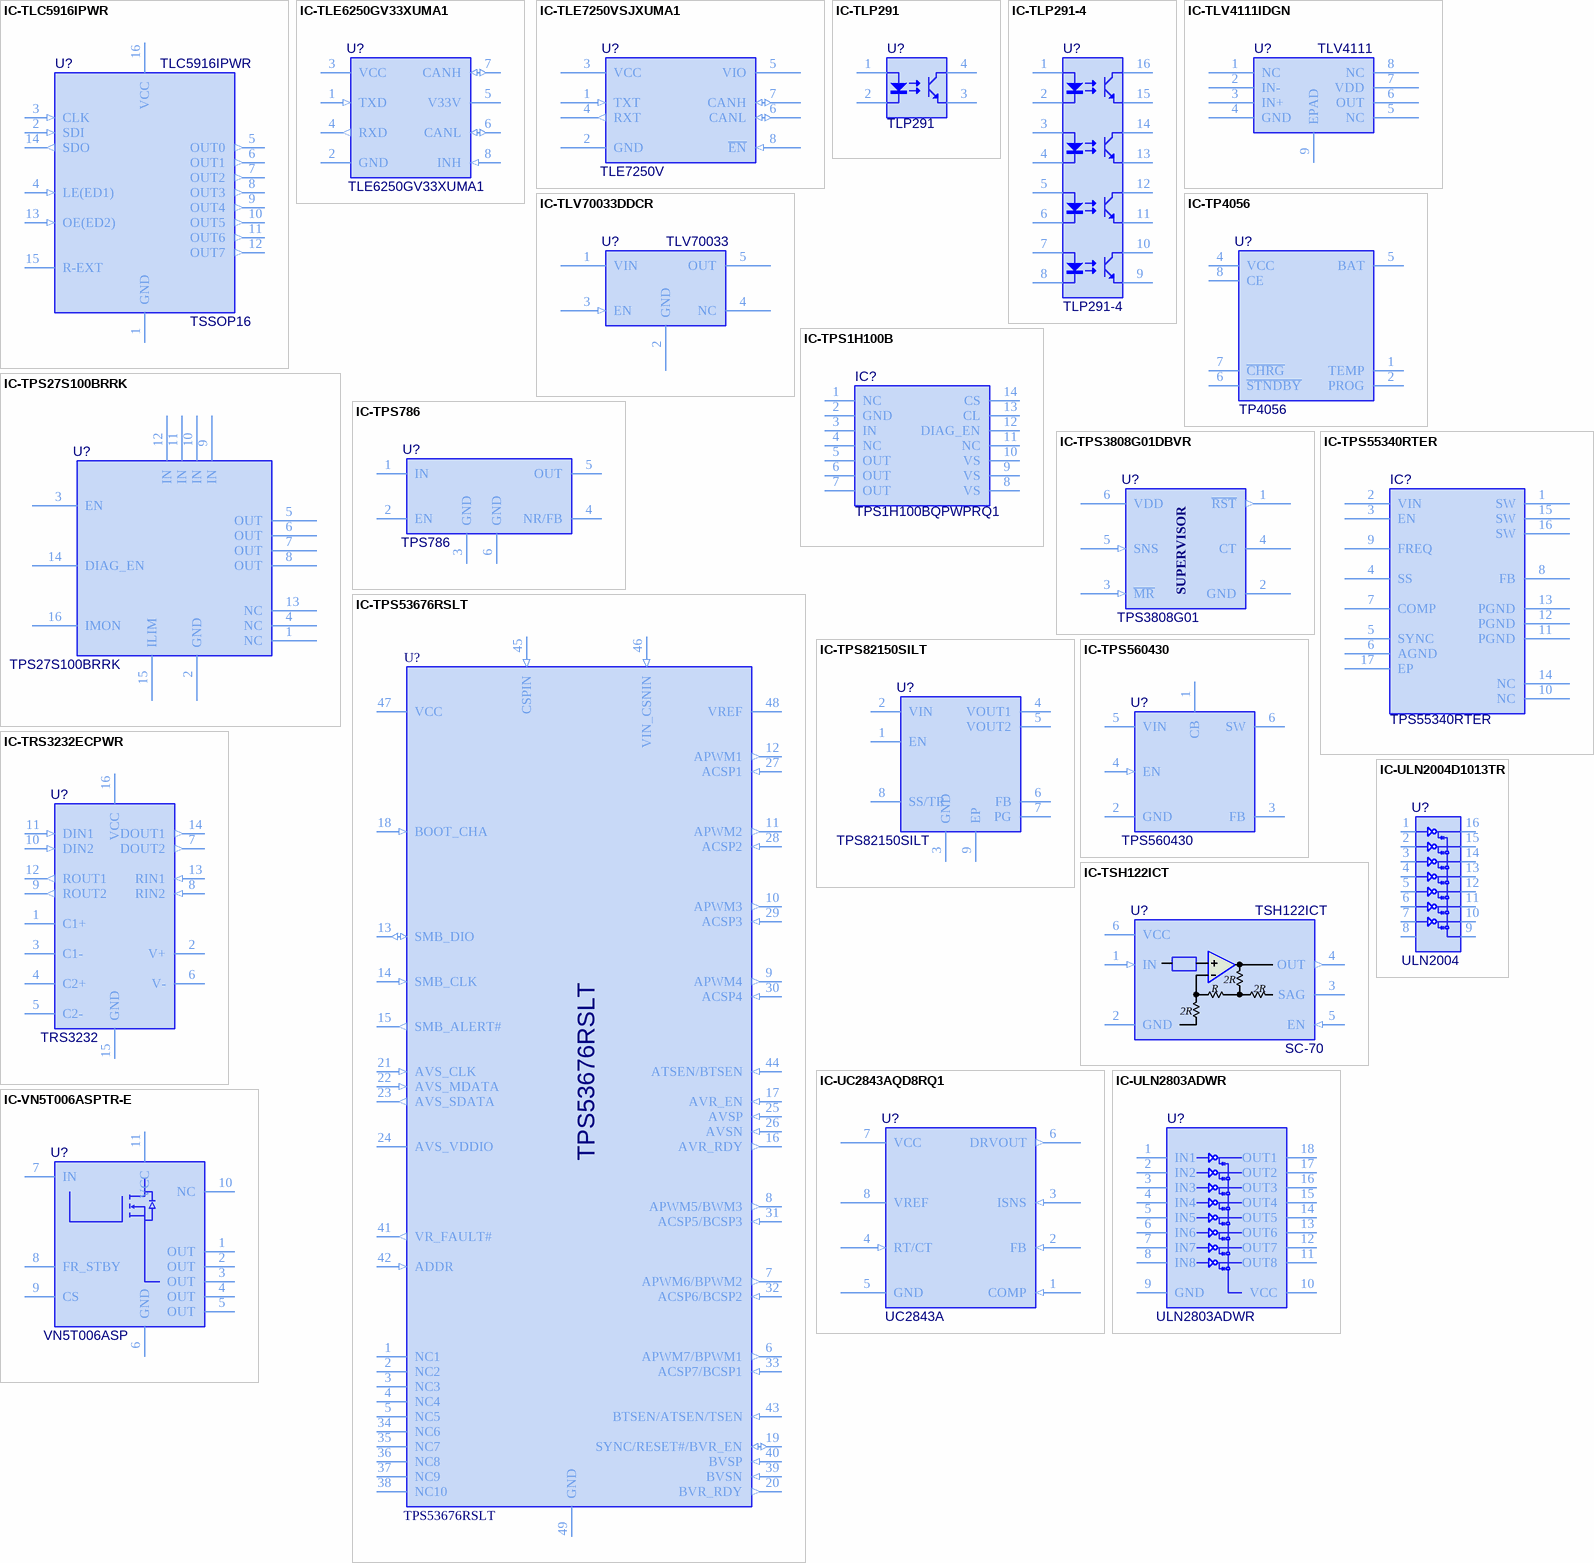
[diagram p36: symbols IC-TLC5916IPWR to IC-VN5T006ASPTR-E]

## IC-TLC5916IPWR
designator U?, comment TLC5916IPWR  Case/Package: TSSOP16
IC LED DRIVER LINEAR 16-TSSOP; Manufacturer: Texas Instruments; Max Power Dissipation: 900mW; Number of Outputs: 8; Frequency: 30MHz; Max Supply Voltage: 5.5V; Min Supply Voltage: 3V; Nominal Supply Current: 22mA; Output Current: 120mA; Output Voltage: 17V; Low Level Output Current: 1mA; High Level Output Current: -1mA; Topology: Boost; Washability: OK; Supplier 1: Digi-Key; Manufacturer Part Number: TLC5916IPWR; Stock 1: 35679; Pricing 1: 1=1.41, 10=1.258, 100=0.9808, 500=0.8102, 1000=0.63963 (USD); Number of Pins: 16; Weight: 0.002183oz; Contact Plating: Gold; Min Operating Temperature: -40°C; Max Operating Temperature: 125°C; Package Quantity: 1; Packaging: Tape and Reel; Max Output Current: 120mA; Max Input Voltage: 5.5V; Min Input Voltage: 3V; Max Supply Current: 22mA; Power Dissipation: 900mW; Number of Segments: 8; Switching Frequency: 30MHz; Radiation Hardening: No; Lead Free: Lead Free; REACH SVHC: No SVHC; ComponentLink1URL: http://www.farnell.com/datasheets/1887543.pdf; ComponentLink1Description: http://www.farnell.com/datasheets/1887543.pdf; ComponentLink2URL: http://www.ti.com/lit/ds/symlink/tlc5917.pdf; ComponentLink2Description: http://www.ti.com/lit/ds/symlink/tlc5917.pdf; ComponentLink3URL: https://www.verical.com/server-webapp/html/getDatasheet?partID=297377; ComponentLink3Description: https://www.verical.com/server-webapp/html/getDatasheet?partID=297377; ComponentLink4URL: http://datasheet.iiic.cc/texas_instruments/TLC5916IPWR.pdf; ComponentLink4Description: http://datasheet.iiic.cc/texas_instruments/TLC5916IPWR.pdf; Supplier Part Number 1: 296-22711-6-ND
footprint TSSOP16
pins: 1 GND (power), 2 SDI (in), 3 CLK (in), 4 LE(ED1) (in), 5 OUT0 (out), 6 OUT1 (out), 7 OUT2 (out), 8 OUT3 (out), 9 OUT4 (out), 10 OUT5 (out), 11 OUT6 (out), 12 OUT7 (out), 13 OE(ED2) (in), 14 SDO (out), 15 R-EXT, 16 VCC (power)

## IC-TLE6250GV33XUMA1
designator U?, comment TLE6250GV33XUMA1
CAN 1MBd Standby 5V Automotive 8-Pin DSO T/R; Manufacturer: Infineon; Min Supply Voltage: 4.5V; Max Supply Voltage: 5.5V; Number of Transceivers: 1; Nominal Supply Current: 70mA; Quiescent Current: 10A; Washability: OK; Supplier 1: Digi-Key; Manufacturer Part Number: TLE6250GV33XUMA1; Stock 1: 11250; Pricing 1: 1=1.63000, 10=1.45700, 100=1.13620, 500=0.93860, 1000=0.74100 (USD); RoHS: Yes; Mount: Surface Mount; Case/Package: SOIC; Number of Pins: 8; Min Operating Temperature: -40°C; Max Operating Temperature: 150°C; Operating Supply Voltage: 5V; Packaging: Tape and Reel; Lead Free: Lead Free; Halogen Free: Halogen Free; ComponentLink1URL: https://datasheet.ciiva.com/25624/0900766b81074499-25624341.pdf?src-supplier=RSComponents; ComponentLink1Description: https://datasheet.ciiva.com/25624/0900766b81074499-25624341.pdf?src-supplier=RSComponents; Supplier Part Number 1: TLE6250GV33XUMA1CT-ND
footprint INF-PG-DSO-8-16_M (SOP, 8-Leads, Body 4.9x3.9mm, Pitch 1.27mm, IPC Low Density)
pins: 1 TXD (in) "CAN transmit data input; 20 k ohm pull-up, LOW in dominant state", 2 GND (power) "Ground", 3 VCC (power) "5 V Supply input", 4 RXD (out) "CAN receive data output; LOW in dominant state, integrated pull-up", 5 V33V (power) "Logic supply input;3.3 V OR 5 V microcontroller logic supply can be connected here! The digital I/Os of the TLE6250GV33 adopt to the connected microcontroller logic supply at V33V", 6 CANL (io) "Low line I/O; LOW in dominant state", 7 CANH (io) "High line I/O; HIGH in dominant state", 8 INH (in) "Inhibit Input; control input, 20 k ohm pull, set LOW for normal mode"

## IC-TLE7250VSJXUMA1
designator U?, comment TLE7250V